# Altium footprint library Conectores.PcbLib: 122 footprints (part 8 of 8)
Each footprint in its own frame and in the unit in brackets; x right, y up, seen from the top. Pads: shape width x height; smd on the part's side, far side on the other; paste and mask are expansions set on the pad; w line width, h text height; cw(c..) or ccw(c..) is an arc to the next point about the centre after c.
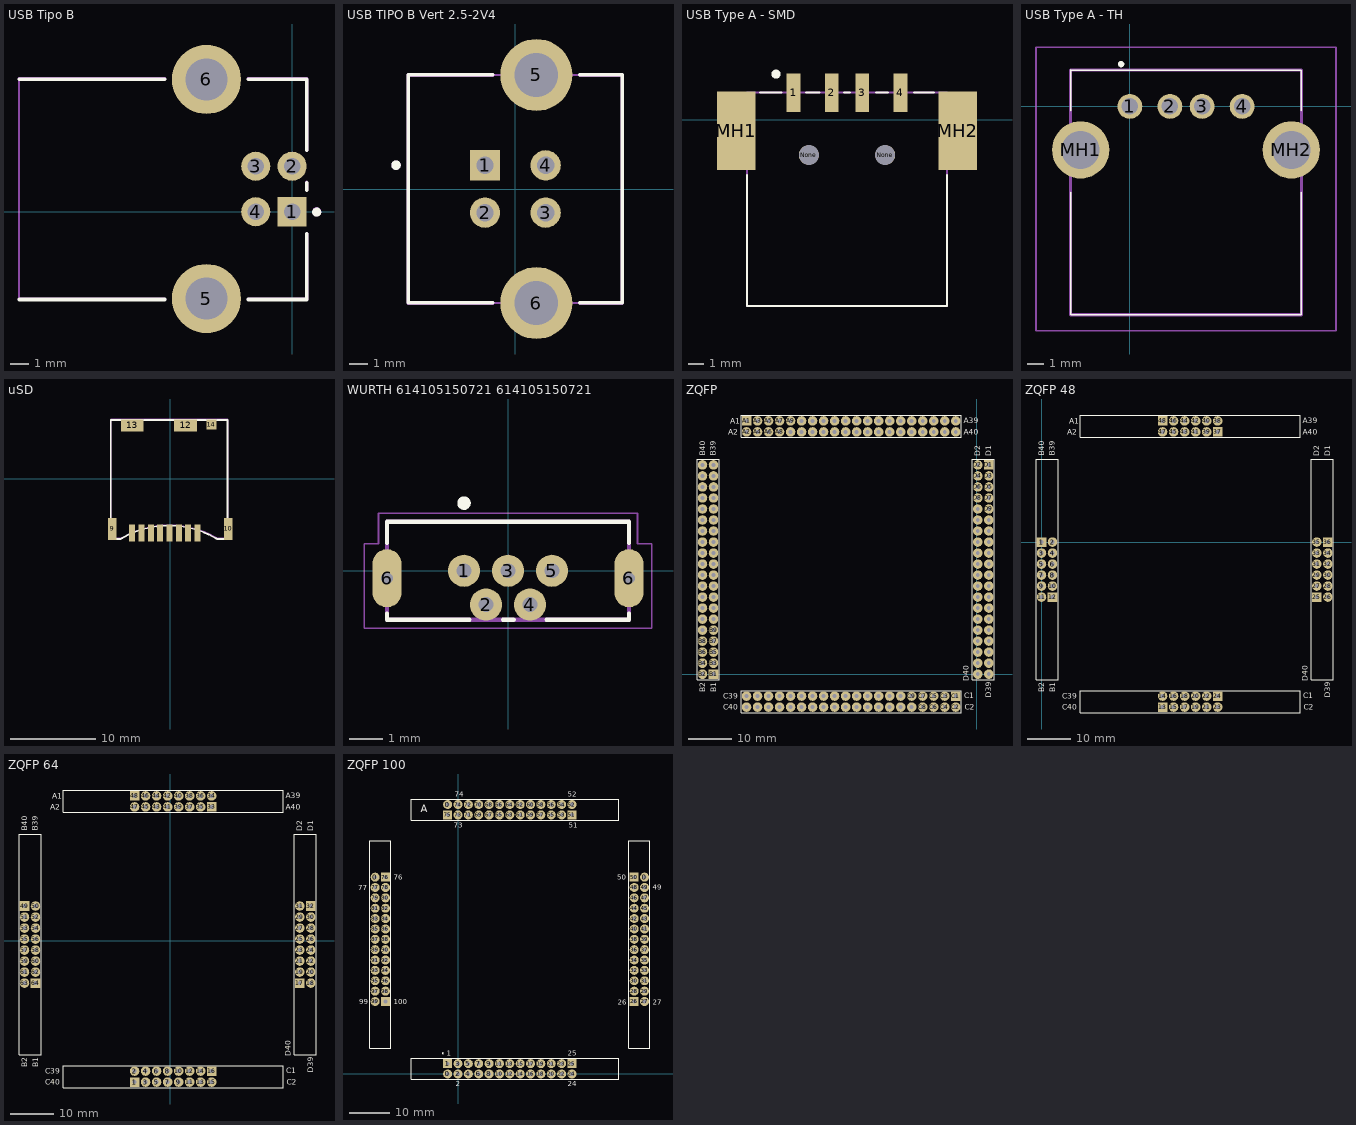
[diagram p7: the footprints below, top view; thin cyan lines are the x and y axes]

## USB Tipo B [mm]
pads (6):
  rect 1.6x1.6 hole 0.92: 1(0,0)
  round 1.6 hole 0.92: 2(0,2.5) 3(-2,2.5) 4(-2,0)
  round 3.8 hole 2.3: 5(-4.71,-4.77) 6(-4.71,7.27)
Top Overlay:
  circle w0.25: c1.35,-0.02 r0.125
  lines w0.2: -14.99,-4.82 -7.01,-4.82 ; -14.99,7.28 -7.01,7.28 ; -2.41,-4.82 0.81,-4.82 0.81,-1.22 ; -2.41,7.28 0.81,7.28 0.81,3.37 ; 0.81,1.18 0.81,1.59
Mechanical 1:
  lines w0.1: -15.01,-4.8 -15.01,7.3
  text "PCB Edge" at -14.685,6.902 h0.25
Mechanical 29:
  circle w0.25: c1.35,0 r0.125
  lines w0.2: -14.99,-4.8 -7.01,-4.8 ; -14.99,7.3 -7.01,7.3 ; -2.41,-4.8 0.81,-4.8 0.81,-1.2 ; -2.41,7.3 0.81,7.3 0.81,3.39 ; 0.81,1.2 0.81,1.61
  text "'.Designator'" at -3.438,-0.378 h0.5
3D body "USB-B-S-F-B-TH.step": height 10.55, standoff -3.67, extent -15.369,-6.315 0.931,8.544

## USB TIPO B Vert 2.5-2V4 [mm] "Connector; USB1.1, Type B, Thru-Hole; 4 Position; Vertical"
height 16
pads (6):
  rect 1.6x1.6 hole 0.92: 1(-1.6,1.25)
  round 1.6 hole 0.92: 2(-1.6,-1.25) 3(1.6,-1.25) 4(1.6,1.25)
  round 3.8 hole 2.3: 5(1.11,6.02) 6(1.11,-6.02)
Top Overlay:
  circle w0.25: c-6.3,1.26 r0.125
  lines w0.2: -1.19,-6.01 -5.65,-6.01 -5.65,6.03 -1.19,6.03 ; 3.41,-6.01 5.65,-6.01 5.65,6.03 3.41,6.03
Mechanical 13:
  lines w0.1: -5.65,-6.02 -5.65,6.02 5.65,6.02 5.65,-6.02 -5.65,-6.02
Mechanical 29:
  circle w0.25: c-6.3,1.25 r0.125
  lines w0.2: -1.19,-6.02 -5.65,-6.02 -5.65,6.02 -1.19,6.02 ; 3.41,-6.02 5.65,-6.02 5.65,6.02 3.41,6.02
  text "'.Designator'" at -4.558,-5.518 h0.5
3D body "mouser_806-kusbvx-bs1n-b.step": height 16, standoff -3.8, extent -5.28,-7.197 6.02,7.095

## USB Type A - SMD [mm] "UJ2-AH-1-SMT"
pads (8):
  rect 0.9x2.5 smd: 1(18.05,1.78) 2(20.55,1.78) 3(22.55,1.78) 4(25.05,1.78)
  rect 2.5x5.15 smd: MH1(14.3,-0.7) MH2(28.8,-0.7)
  round 1.3 hole 1.3 unplated: None(19.05,-2.3) None(24.05,-2.3)
Top Overlay:
  circle w0.3: c16.9,3 r0.15
  lines w0.127: 15,-3.6 15,-12.2 28.1,-12.2 28.1,-3.6 ; 15.85,1.8 17.25,1.8 ; 18.85,1.8 19.75,1.8 ; 21.35,1.8 21.75,1.8 ; 23.45,1.8 24.25,1.8 ; 25.95,1.8 27.25,1.8
Mechanical 4:
  lines w0.127: 15,-12.2 15,1.8 ; 15,-12.2 28.1,-12.2 ; 15,-12.2 15,1.8 ; 15,-12.2 28.1,-12.2 ; 15,1.8 28.1,1.8 ; 15,1.8 28.1,1.8 ; 28.1,-12.2 28.1,1.8 ; 28.1,-12.2 28.1,1.8
3D body "USB Type A - SMD.step": height 7.6, standoff -0.8, extent 13.6,-12.2 29.5,2.6

## USB Type A - TH [mm] "USB tipo A"
pads (6):
  round 1.545 hole 1.03: 1(0,0) 2(2.5,0) 3(4.5,0) 4(7,0)
  round 3.57 hole 2.38: MH1(-3.07,-2.71) MH2(10.07,-2.71)
Top Overlay:
  lines w0.1: -3.7,-5.36 -3.7,-12.99 10.7,-12.99 10.7,-5.36 ; -3.7,-0.28 -3.7,2.27 10.7,2.26 10.7,-0.28
  lines w0.3: -0.6,2.64 ccw(c-0.55,2.64) -0.5,2.64 ccw(c-0.55,2.64) -0.6,2.64
Mechanical 13:
  lines w0.2: -3.7,-12.99 -3.7,2.27 10.7,2.27 10.7,-12.99 -3.7,-12.99
Mechanical 15:
  lines w0.1: -5.855,-13.99 -5.855,3.69 12.855,3.69 12.855,-13.99 -5.855,-13.99
3D body "USB-A-01.step": height 7.05, standoff -4.1, extent -4.35,-12.5 11.45,1.2

## uSD [mm] "DM3CS"
pads (13):
  rect 0.7x2 smd: 1(3.212,-6.4) 2(2.112,-6.4) 3(1.012,-6.4) 4(-0.088,-6.4) 5(-1.188,-6.4) 6(-2.288,-6.4) 7(-3.388,-6.4) 8(-4.488,-6.4)
  rect 1x2.6 smd: 9(-6.838,-5.9) 10(6.838,-5.9)
  rect 2.7x1.4 smd: 12(1.812,6.3) 13(-4.488,6.3)
  rect 1.2x1.2 smd: 14(4.862,6.4)
Top Overlay:
  lines w0.2: 6.71,-7.095 5.541,-7.095 ccw(c-0.161,-16.631) -5.863,-7.095 -7.032,-7.095 -7.032,6.951 6.76,6.951 6.76,-7.095
Mechanical 29:
  lines w0.2: 6.74,-7.035 5.571,-7.035 ccw(c-0.131,-16.571) -5.833,-7.035 -7.002,-7.035 -7.002,7.011 6.79,7.011 6.79,-7.035
  text "'.Designator'" at -6.416,-3.862 h0.5
3D body "DM3CS-SF.stp": height 1.98, standoff 0.05, extent -6.705,-7.213 7.095,6.887

## WURTH 614105150721 614105150721 [mm] "CONN RCPT USB2.0 MICRO B VERT"
pads (7):
  round 0.948 hole 0.44: 1(-1.3,0) 2(-0.65,-1) 3(0,0) 4(0.65,-1) 5(1.3,0)
  oval 0.858x1.716 hole 0.35: 6(-3.575,-0.22) 6(3.575,-0.22)
Top Overlay:
  circle w0.2: c-1.3,2 r0.1
  lines w0.127: -3.575,-1.26 -3.575,-1.45 -1.14,-1.45 ; -3.575,0.82 -3.575,1.45 3.575,1.45 3.575,0.82 ; -0.15,-1.45 0.17,-1.45 ; 1.14,-1.45 3.575,-1.45 3.575,-1.26
Mechanical 1:
  lines w0: -3.75,-0.72 ccw(c-3.575,-0.72) -3.575,-0.895 ccw(c-3.575,-0.72) -3.4,-0.72 -3.4,0.28 ccw(c-3.575,0.28) -3.575,0.455 ccw(c-3.575,0.28) -3.75,0.28 -3.75,-0.72 ; 3.4,-0.72 ccw(c3.575,-0.72) 3.575,-0.895 ccw(c3.575,-0.72) 3.75,-0.72 3.75,0.28 ccw(c3.575,0.28) 3.575,0.455 ccw(c3.575,0.28) 3.4,0.28 3.4,-0.72
Mechanical 4:
  circle w0.2: c-1.3,0 r0.1
  circle w0.2: c-1.3,0 r0.1
  lines w0.127: -3.575,-1.45 3.575,-1.45 ; -3.575,-1.45 -3.575,1.45 ; -3.575,-1.45 3.575,-1.45 ; -3.575,-1.45 -3.575,1.45 ; -3.575,1.45 3.575,1.45 ; -3.575,1.45 3.575,1.45 ; 3.575,-1.45 3.575,1.45 ; 3.575,-1.45 3.575,1.45
Mechanical 16:
  lines w0.05: -4.25,-1.7 -4.25,0.8 -3.825,0.8 -3.825,1.7 3.825,1.7 3.825,0.8 4.25,0.8 4.25,-1.7 -4.25,-1.7
3D body "614105150721.stp": height 5.66, standoff -1.49, extent -4.05,-1.55 3.95,1.35

## ZQFP [mm] "Zócalo QFP Genérico"
pads (160):
  rect 2.2x2.2 hole 0.9: A1(-53.086,58.42) B1(-60.706,-0.01) C1(-4.826,-5.08) D1(2.794,48.25)
  round 2.2 hole 0.9: A2(-53.086,55.88) A3(-50.546,58.42) A4(-50.546,55.88) A5(-48.006,58.42) A6(-48.006,55.88) A7(-45.466,58.42) A8(-45.466,55.88) A9(-42.926,58.42) A10(-42.926,55.88) A11(-40.386,58.42) A12(-40.386,55.88) A13(-37.846,58.42) A14(-37.846,55.88) A15(-35.306,58.42) A16(-35.306,55.88) A17(-32.766,58.42) A18(-32.766,55.88) A19(-30.226,58.42) A20(-30.226,55.88) A21(-27.686,58.42) A22(-27.686,55.88) A23(-25.146,58.42) A24(-25.146,55.88) A25(-22.606,58.42) A26(-22.606,55.88) A27(-20.066,58.42) A28(-20.066,55.88) A29(-17.526,58.42) A30(-17.526,55.88) A31(-14.986,58.42) A32(-14.986,55.88) A33(-12.446,58.42) A34(-12.446,55.88) A35(-9.906,58.42) A36(-9.906,55.88) A37(-7.366,58.42) A38(-7.366,55.88) A39(-4.826,58.42) A40(-4.826,55.88) B2(-63.246,-0.01) B3(-60.706,2.53) B4(-63.246,2.53) B5(-60.706,5.07) B6(-63.246,5.07) B7(-60.706,7.61) B8(-63.246,7.61) B9(-60.706,10.15) B10(-63.246,10.15) B11(-60.706,12.69) B12(-63.246,12.69) B13(-60.706,15.23) B14(-63.246,15.23) B15(-60.706,17.77) B16(-63.246,17.77) B17(-60.706,20.31) B18(-63.246,20.31) B19(-60.706,22.85) B20(-63.246,22.85) B21(-60.706,25.39) B22(-63.246,25.39) B23(-60.706,27.93) B24(-63.246,27.93) B25(-60.706,30.47) B26(-63.246,30.47) B27(-60.706,33.01) B28(-63.246,33.01) B29(-60.706,35.55) B30(-63.246,35.55) B31(-60.706,38.09) B32(-63.246,38.09) B33(-60.706,40.63) B34(-63.246,40.63) B35(-60.706,43.17) B36(-63.246,43.17) B37(-60.706,45.71) B38(-63.246,45.71) B39(-60.706,48.25) B40(-63.246,48.25) C2(-4.826,-7.62) C3(-7.366,-5.08) C4(-7.366,-7.62) C5(-9.906,-5.08) C6(-9.906,-7.62) C7(-12.446,-5.08) C8(-12.446,-7.62) C9(-14.986,-5.08) C10(-14.986,-7.62) C11(-17.526,-5.08) C12(-17.526,-7.62) C13(-20.066,-5.08) C14(-20.066,-7.62) C15(-22.606,-5.08) C16(-22.606,-7.62) C17(-25.146,-5.08) C18(-25.146,-7.62) C19(-27.686,-5.08) C20(-27.686,-7.62) C21(-30.226,-5.08) C22(-30.226,-7.62) C23(-32.766,-5.08) C24(-32.766,-7.62) C25(-35.306,-5.08) C26(-35.306,-7.62) C27(-37.846,-5.08) C28(-37.846,-7.62) C29(-40.386,-5.08) C30(-40.386,-7.62) C31(-42.926,-5.08) C32(-42.926,-7.62) C33(-45.466,-5.08) C34(-45.466,-7.62) C35(-48.006,-5.08) C36(-48.006,-7.62) C37(-50.546,-5.08) C38(-50.546,-7.62) C39(-53.086,-5.08) C40(-53.086,-7.62) D2(0.254,48.25) D3(2.794,45.71) D4(0.254,45.71) D5(2.794,43.17) D6(0.254,43.17) D7(2.794,40.63) D8(0.254,40.63) D9(2.794,38.09) D10(0.254,38.09) D11(2.794,35.55) D12(0.254,35.55) D13(2.794,33.01) D14(0.254,33.01) D15(2.794,30.47) D16(0.254,30.47) D17(2.794,27.93) D18(0.254,27.93) D19(2.794,25.39) D20(0.254,25.39) D21(2.794,22.85) D22(0.254,22.85) D23(2.794,20.31) D24(0.254,20.31) D25(2.794,17.77) D26(0.254,17.77) D27(2.794,15.23) D28(0.254,15.23) D29(2.794,12.69) D30(0.254,12.69) D31(2.794,10.15) D32(0.254,10.15) D33(2.794,7.61) D34(0.254,7.61) D35(2.794,5.07) D36(0.254,5.07) D37(2.794,2.53) D38(0.254,2.53) D39(2.794,-0.01) D40(0.254,-0.01)
Top Overlay:
  lines w0.2: -64.516,-1.28 -64.516,49.52 -59.436,49.52 -59.436,-1.28 -64.516,-1.28 ; -54.356,-8.89 -3.556,-8.89 -3.556,-3.81 -54.356,-3.81 -54.356,-8.89 ; -54.356,54.61 -3.556,54.61 -3.556,59.69 -54.356,59.69 -54.356,54.61 ; -1.016,-1.28 -1.016,49.52 4.064,49.52 4.064,-1.28 -1.016,-1.28
  text "D1" at 3.422,50.277 h1.27
  text "D2" at 0.804,50.28 h1.27
  text "D40" at -1.785,-1.666 h1.27
  text "D39" at 3.422,-5.476 h1.27
  text "B1" at -60.078,-4.206 h1.27
  text "B2" at -62.618,-4.206 h1.27
  text "B40" at -62.618,50.404 h1.27
  text "B39" at -60.205,50.404 h1.27
  text "A1" at -56.903,57.77 h1.27
  text "A2" at -57.284,55.23 h1.27
  text "A40" at -2.928,55.23 h1.27
  text "A39" at -2.928,57.897 h1.27
  text "C1" at -2.826,-5.62 h1.27
  text "C2" at -2.801,-8.27 h1.27
  text "C40" at -58.427,-8.27 h1.27
  text "C39" at -58.427,-5.73 h1.27
Mechanical 29:
  text "'.Designator'" at -54.418,-2.072 h0.5
3D body "Generic QFT 160p.STEP": height 10.12, standoff -1.99, extent -65.907,-10.762 6.223,61.468

## ZQFP 48 [mm] "ZQFP 48 pines"
pads (48):
  rect 2.2x2.2 hole 0.9: 1(0,0) 12(2.54,-12.7) 13(27.94,-38.09) 24(40.64,-35.55) 25(63.5,-12.7) 36(66.04,0) 37(40.64,25.41) 48(27.94,27.95)
  round 2.2 hole 0.9: 2(2.54,0) 3(0,-2.54) 4(2.54,-2.54) 5(0,-5.08) 6(2.54,-5.08) 7(0,-7.62) 8(2.54,-7.62) 9(0,-10.16) 10(2.54,-10.16) 11(0,-12.7) 14(27.94,-35.55) 15(30.48,-38.09) 16(30.48,-35.55) 17(33.02,-38.09) 18(33.02,-35.55) 19(35.56,-38.09) 20(35.56,-35.55) 21(38.1,-38.09) 22(38.1,-35.55) 23(40.64,-38.09) 26(66.04,-12.7) 27(63.5,-10.16) 28(66.04,-10.16) 29(63.5,-7.62) 30(66.04,-7.62) 31(63.5,-5.08) 32(66.04,-5.08) 33(63.5,-2.54) 34(66.04,-2.54) 35(63.5,0) 38(40.64,27.95) 39(38.1,25.41) 40(38.1,27.95) 41(35.56,25.41) 42(35.56,27.95) 43(33.02,25.41) 44(33.02,27.95) 45(30.48,25.41) 46(30.48,27.95) 47(27.94,25.41)
Top Overlay:
  lines w0.2: -1.27,-31.75 -1.27,19.05 3.81,19.05 3.81,-31.75 -1.27,-31.75 ; 8.89,-39.36 59.69,-39.36 59.69,-34.28 8.89,-34.28 8.89,-39.36 ; 8.89,24.14 59.69,24.14 59.69,29.22 8.89,29.22 8.89,24.14 ; 62.23,-31.75 62.23,19.05 67.31,19.05 67.31,-31.75 62.23,-31.75
  text "D1" at 66.668,19.807 h1.27
  text "D2" at 64.05,19.81 h1.27
  text "D40" at 61.461,-32.136 h1.27
  text "D39" at 66.668,-35.946 h1.27
  text "B1" at 3.168,-34.676 h1.27
  text "B2" at 0.628,-34.676 h1.27
  text "B40" at 0.628,19.934 h1.27
  text "B39" at 3.041,19.934 h1.27
  text "A1" at 6.343,27.3 h1.27
  text "A2" at 5.962,24.76 h1.27
  text "A40" at 60.318,24.76 h1.27
  text "A39" at 60.318,27.427 h1.27
  text "C1" at 60.42,-36.09 h1.27
  text "C2" at 60.445,-38.74 h1.27
  text "C40" at 4.819,-38.74 h1.27
  text "C39" at 4.819,-36.2 h1.27
3D body "Generic QFT 48p.STEP": height 8.84, standoff -3.27, extent -2.664,-41.275 69.466,30.955

## ZQFP 64 [mm]
pads (64):
  rect 2.2x2.2 hole 0.9: 1(-8.255,-32.639) 16(9.525,-30.099) 17(29.845,-9.789) 32(32.385,7.991) 33(9.525,30.861) 48(-8.255,33.401) 49(-33.655,7.991) 64(-31.115,-9.789)
  round 2.2 hole 0.9: 2(-8.255,-30.099) 3(-5.715,-32.639) 4(-5.715,-30.099) 5(-3.175,-32.639) 6(-3.175,-30.099) 7(-0.635,-32.639) 8(-0.635,-30.099) 9(1.905,-32.639) 10(1.905,-30.099) 11(4.445,-32.639) 12(4.445,-30.099) 13(6.985,-32.639) 14(6.985,-30.099) 15(9.525,-32.639) 18(32.385,-9.789) 19(29.845,-7.249) 20(32.385,-7.249) 21(29.845,-4.709) 22(32.385,-4.709) 23(29.845,-2.169) 24(32.385,-2.169) 25(29.845,0.371) 26(32.385,0.371) 27(29.845,2.911) 28(32.385,2.911) 29(29.845,5.451) 30(32.385,5.451) 31(29.845,7.991) 34(9.525,33.401) 35(6.985,30.861) 36(6.985,33.401) 37(4.445,30.861) 38(4.445,33.401) 39(1.905,30.861) 40(1.905,33.401) 41(-0.635,30.861) 42(-0.635,33.401) 43(-3.175,30.861) 44(-3.175,33.401) 45(-5.715,30.861) 46(-5.715,33.401) 47(-8.255,30.861) 50(-31.115,7.991) 51(-33.655,5.451) 52(-31.115,5.451) 53(-33.655,2.911) 54(-31.115,2.911) 55(-33.655,0.371) 56(-31.115,0.371) 57(-33.655,-2.169) 58(-31.115,-2.169) 59(-33.655,-4.709) 60(-31.115,-4.709) 61(-33.655,-7.249) 62(-31.115,-7.249) 63(-33.655,-9.789)
Top Overlay:
  lines w0.2: 26.035,-33.909 -24.765,-33.909 -24.765,-28.829 26.035,-28.829 ; 26.045,-33.909 26.045,-28.829 ; -34.925,-26.299 -29.845,-26.299 -29.845,24.501 -34.925,24.501 -34.925,-26.299 ; -24.765,29.591 -24.765,34.671 26.035,34.671 26.035,29.591 -24.765,29.591 ; 28.575,-26.299 33.655,-26.299 33.655,24.501 28.575,24.501 28.575,-26.299
  text "C39" at -28.836,-30.749 h1.27
  text "C40" at -28.836,-33.289 h1.27
  text "C2" at 26.79,-33.289 h1.27
  text "C1" at 26.765,-30.639 h1.27
  text "A39" at 26.663,32.878 h1.27
  text "A40" at 26.663,30.211 h1.27
  text "A2" at -27.693,30.211 h1.27
  text "A1" at -27.312,32.751 h1.27
  text "B39" at -30.614,25.385 h1.27
  text "B40" at -33.027,25.385 h1.27
  text "B2" at -33.027,-29.225 h1.27
  text "B1" at -30.487,-29.225 h1.27
  text "D39" at 33.013,-30.495 h1.27
  text "D40" at 27.806,-26.685 h1.27
  text "D2" at 30.395,25.261 h1.27
  text "D1" at 33.013,25.258 h1.27

## ZQFP 100 [mm]
pads (104):
  round 2.2 hole 0.9: 0(-20.32,48.25) 0(-2.54,0) 0(-2.54,66.04) 0(45.72,48.25) 2(0,0) 3(0,2.54) 4(2.54,0) 5(2.54,2.54) 6(5.08,0) 7(5.08,2.54) 8(7.62,0) 9(7.62,2.54) 10(10.16,0) 11(10.16,2.54) 12(12.7,0) 13(12.7,2.54) 14(15.24,0) 15(15.24,2.54) 16(17.78,0) 17(17.78,2.54) 18(20.32,0) 19(20.32,2.54) 20(22.86,0) 21(22.86,2.54) 22(25.4,0) 23(25.4,2.54) 24(27.94,0) 27(45.72,17.77) 28(43.18,20.31) 29(45.72,20.31) 30(43.18,22.85) 31(45.72,22.85) 32(43.18,25.39) 33(45.72,25.39) 34(43.18,27.93) 35(45.72,27.93) 36(43.18,30.47) 37(45.72,30.47) 38(43.18,33.01) 39(45.72,33.01) 40(43.18,35.55) 41(45.72,35.55) 42(43.18,38.09) 43(45.72,38.09) 44(43.18,40.63) 45(45.72,40.63) 46(43.18,43.17) 47(45.72,43.17) 48(43.18,45.71) 49(45.72,45.71) 52(27.94,66.04) 53(25.4,63.5) 54(25.4,66.04) 55(22.86,63.5) 56(22.86,66.04) 57(20.32,63.5) 58(20.32,66.04) 59(17.78,63.5) 60(17.78,66.04) 61(15.24,63.5) 62(15.24,66.04) 63(12.7,63.5) 64(12.7,66.04) 65(10.16,63.5) 66(10.16,66.04) 67(7.62,63.5) 68(7.62,66.04) 69(5.08,63.5) 70(5.08,66.04) 71(2.54,63.5) 72(2.54,66.04) 73(0,63.5) 74(0,66.04) 77(-20.32,45.71) 78(-17.78,45.71) 79(-20.32,43.17) 80(-17.78,43.17) 81(-20.32,40.63) 82(-17.78,40.63) 83(-20.32,38.09) 84(-17.78,38.09) 85(-20.32,35.55) 86(-17.78,35.55) 87(-20.32,33.01) 88(-17.78,33.01) 89(-20.32,30.47) 90(-17.78,30.47) 91(-20.32,27.93) 92(-17.78,27.93) 93(-20.32,25.39) 94(-17.78,25.39) 95(-20.32,22.85) 96(-17.78,22.85) 97(-20.32,20.31) 98(-17.78,20.31) 99(-20.32,17.77)
  rect 2.2x2.2 hole 0.9: 1(-2.54,2.54) 25(27.94,2.54) 26(43.18,17.77) 50(43.18,48.25) 51(27.94,63.5) 75(-2.54,63.5) 76(-17.78,48.25) 100(-17.78,17.77)
Top Overlay:
  circle w0.254: c-3.683,5.08 r0.127
  lines w0.2: -21.59,6.34 -16.51,6.34 -16.51,57.14 -21.59,57.14 -21.59,6.34 ; -11.43,-1.27 -11.43,3.81 39.37,3.81 39.37,-1.27 -11.43,-1.27 ; -11.43,62.23 -11.43,67.31 39.37,67.31 39.37,62.23 -11.43,62.23 ; 41.91,6.34 46.99,6.34 46.99,57.14 41.91,57.14 41.91,6.34
  text "1" at -2.794,4.445 h1.27
  text "2" at -0.508,-3.048 h1.27
  text "24" at 26.924,-3.048 h1.27
  text "25" at 26.924,4.445 h1.27
  text "52" at 26.924,67.945 h1.27
  text "51" at 27.178,60.325 h1.27
  text "73" at -1.016,60.325 h1.27
  text "74" at -0.762,67.945 h1.27
  text "76" at -15.748,47.625 h1.27
  text "77" at -24.511,45.085 h1.27
  text "99" at -24.257,17.145 h1.27
  text "100" at -15.748,17.145 h1.27
  text "27" at 47.752,17.018 h1.27
  text "26" at 39.116,17.018 h1.27
  text "50" at 38.989,47.625 h1.27
  text "49" at 47.752,45.212 h1.27
  text "A" at -9.144,64.135 h1.8